# Altium footprint library devices.PCBLIB: 335 footprints (part 19 of 21)
Each footprint in its own frame and in the unit in brackets; x right, y up, seen from the top. Pads: shape width x height; smd on the part's side, far side on the other; paste and mask are expansions set on the pad; w line width, h text height; cw(c..) or ccw(c..) is an arc to the next point about the centre after c.
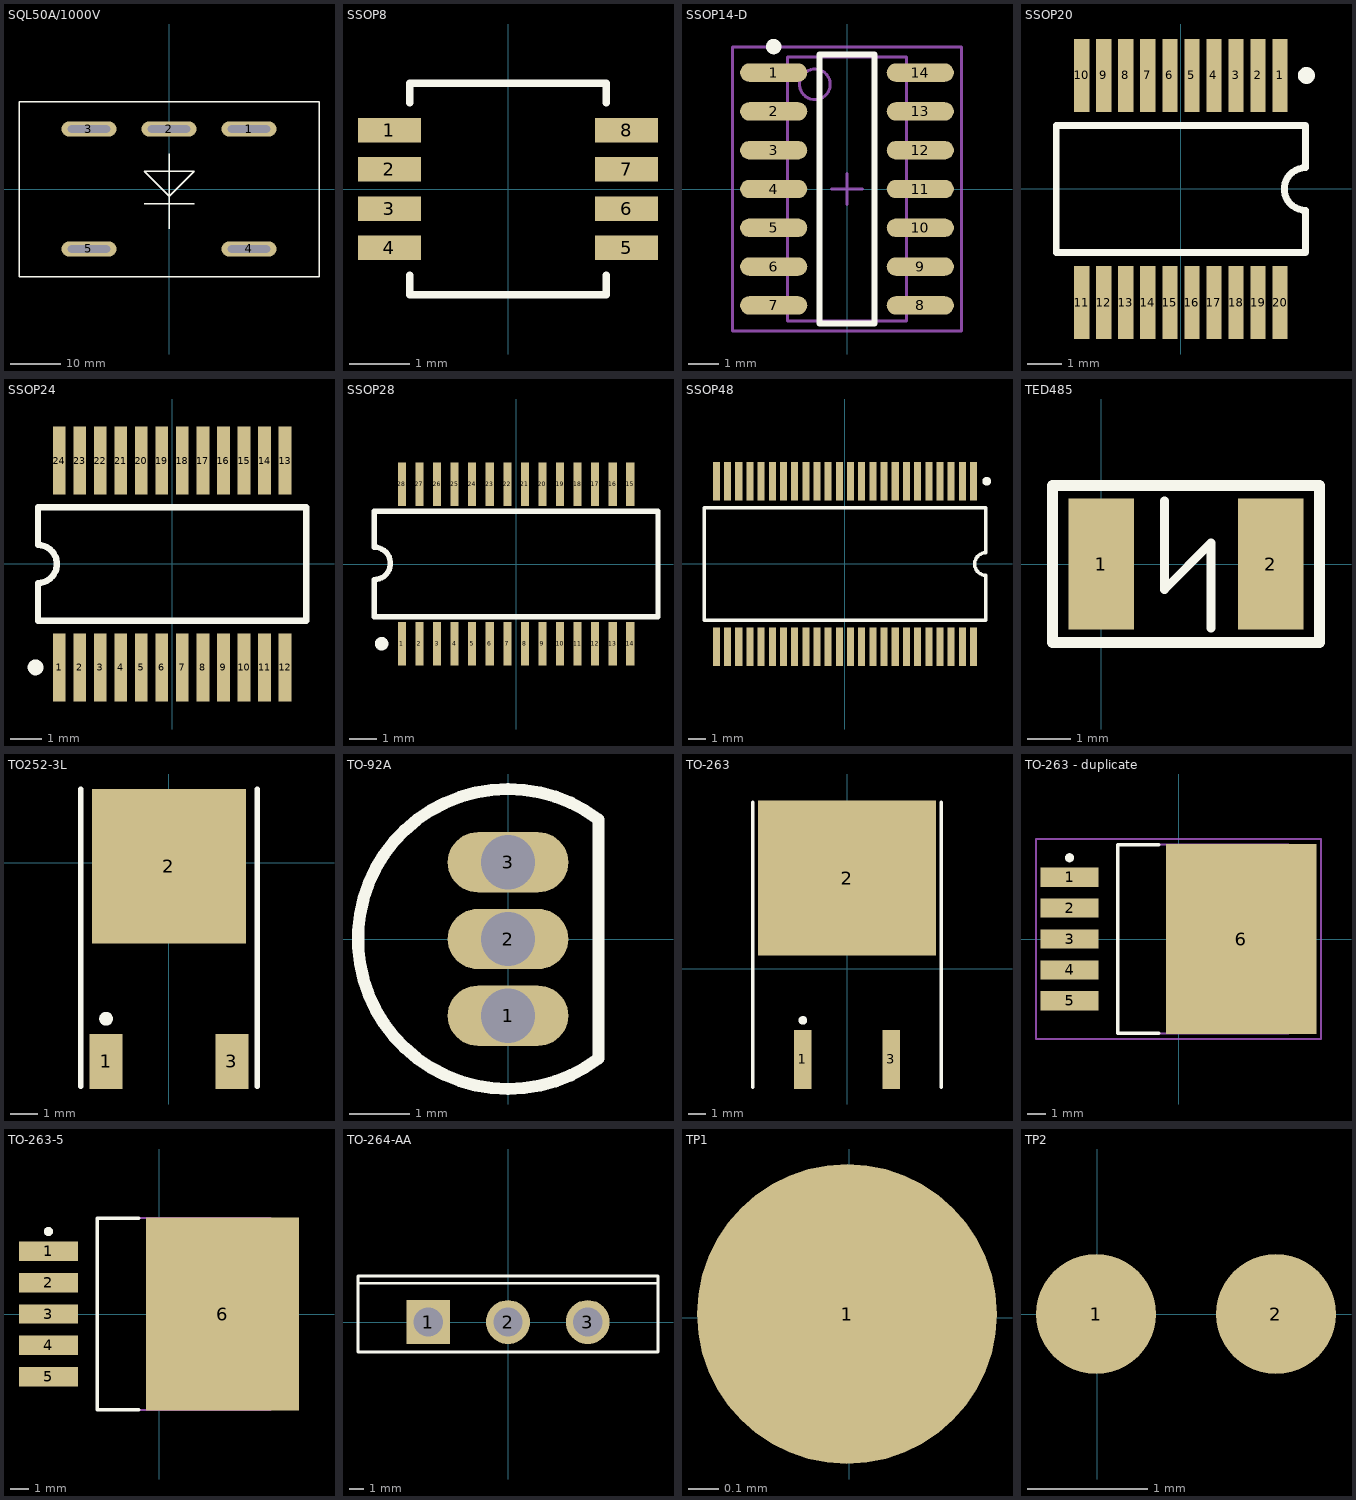
[diagram p18: the footprints below, top view; thin cyan lines are the x and y axes]

## SQL50A/1000V [mm]
pads (5):
  oval 11x3 hole 1.5 slot 8.5 at 0 deg: 1(16,12) 2(0,12) 3(-16,12) 4(16,-12) 5(-16,-12)
Top Overlay:
  lines w0.254: -5,-3 5,-3 ; 0,-8 0,7 ; -30,-17.5 30,-17.5 30,17.5 -30,17.5 -30,-17.5 ; -5,3.5 5,3.5 0,-1.5 -5,3.5

## SSOP8 [mil]
pads (8):
  rect 41x16 smd: 1(-77.26,38.39) 2(-77.26,12.8) 3(-77.26,-12.8) 4(-77.26,-38.39) 5(77.26,-38.39) 6(77.26,-12.8) 7(77.26,12.8) 8(77.26,38.39)
Top Overlay:
  lines w5: -64.09,-56.39 -64.09,-69.01 64.09,-69.01 64.09,-56.39 ; -64.09,56.39 -64.09,69.01 64.09,69.01 64.09,56.39

## SSOP14-D [mm] "SOIC, 14-Leads, Body 8.7x3.9mm, Pitch 1.27mm, IPC Medium Density"
height 1.75
pads (14):
  oval 2.2x0.6 smd: 1(-2.4,3.81) 2(-2.4,2.54) 3(-2.4,1.27) 4(-2.4,0) 5(-2.4,-1.27) 6(-2.4,-2.54) 7(-2.4,-3.81) 8(2.4,-3.81) 9(2.4,-2.54) 10(2.4,-1.27) 11(2.4,0) 12(2.4,1.27) 13(2.4,2.54) 14(2.4,3.81)
Top Overlay:
  circle w0.25: c-2.4,4.66 r0.125
  lines w0.2: -0.9,-4.4 0.9,-4.4 0.9,4.4 -0.9,4.4 -0.9,-4.4
Mechanical 13:
  circle w0.1: c-1.05,3.425 r0.5
  lines w0.1: -1.95,-4.325 1.95,-4.325 1.95,4.325 -1.95,4.325 -1.95,-4.325
Mechanical 15:
  lines w0.1: -0.5,0 0.5,0 ; 0,-0.5 0,0.5 ; -3.75,-4.65 3.75,-4.65 3.75,4.65 -3.75,4.65 -3.75,-4.65
3D body: height 1.75, standoff 0, extent -1.95,-4.325 1.95,4.325

## SSOP20 [mm] "SSOP; 20 Leads; Body Width 5.3 mm; Pitch 0.65 mm"
height 1.99
pads (20):
  rect 0.45x2.15 smd: 1(2.925,3.35) 2(2.275,3.35) 3(1.625,3.35) 4(0.975,3.35) 5(0.325,3.35) 6(-0.325,3.35) 7(-0.975,3.35) 8(-1.625,3.35) 9(-2.275,3.35) 10(-2.925,3.35) 11(-2.925,-3.35) 12(-2.275,-3.35) 13(-1.625,-3.35) 14(-0.975,-3.35) 15(-0.325,-3.35) 16(0.325,-3.35) 17(0.975,-3.35) 18(1.625,-3.35) 19(2.275,-3.35) 20(2.925,-3.35)
Top Overlay:
  circle w0.25: c3.7,3.35 r0.125
  lines w0.2: -3.675,-1.875 -3.675,1.875 3.675,1.875 3.675,0.625 ccw(c3.675,0) 3.675,-0.625 3.675,-1.875 -3.675,-1.875
3D body: height 1.78, standoff -0.21, extent -3.25,-3.975 3.25,3.925

## SSOP24 [mm] "SSOP, Plastic; 24 Leads; Body Width 5.3 mm; Pitch 0.65 mm"
height 2
pads (24):
  rect 0.4x2.15 smd: 1(-3.575,-3.275) 2(-2.925,-3.275) 3(-2.275,-3.275) 4(-1.625,-3.275) 5(-0.975,-3.275) 6(-0.325,-3.275) 7(0.325,-3.275) 8(0.975,-3.275) 9(1.625,-3.275) 10(2.275,-3.275) 11(2.925,-3.275) 12(3.575,-3.275) 13(3.575,3.275) 14(2.925,3.275) 15(2.275,3.275) 16(1.625,3.275) 17(0.975,3.275) 18(0.325,3.275) 19(-0.325,3.275) 20(-0.975,3.275) 21(-1.625,3.275) 22(-2.275,3.275) 23(-2.925,3.275) 24(-3.575,3.275)
Top Overlay:
  circle w0.25: c-4.325,-3.275 r0.125
  lines w0.2: -4.25,-1.8 4.25,-1.8 4.25,1.8 -4.25,1.8 -4.25,0.6 cw(c-4.25,0) -4.25,-0.6 -4.25,-1.8

## SSOP28 [mm] "SSOP, Plastic; 28 Leads; Body Width 5.3 mm; Pitch 0.65 mm"
height 2
pads (28):
  rect 0.3x1.6 smd: 1(-4.225,-2.95) 2(-3.575,-2.95) 3(-2.925,-2.95) 4(-2.275,-2.95) 5(-1.625,-2.95) 6(-0.975,-2.95) 7(-0.325,-2.95) 8(0.325,-2.95) 9(0.975,-2.95) 10(1.625,-2.95) 11(2.275,-2.95) 12(2.925,-2.95) 13(3.575,-2.95) 14(4.225,-2.95) 15(4.225,2.95) 16(3.575,2.95) 17(2.925,2.95) 18(2.275,2.95) 19(1.625,2.95) 20(0.975,2.95) 21(0.325,2.95) 22(-0.325,2.95) 23(-0.975,2.95) 24(-1.625,2.95) 25(-2.275,2.95) 26(-2.925,2.95) 27(-3.575,2.95) 28(-4.225,2.95)
Top Overlay:
  circle w0.25: c-4.975,-2.95 r0.125
  lines w0.2: -5.25,-1.95 5.25,-1.95 5.25,1.95 -5.25,1.95 -5.25,0.625 cw(c-5.25,0.025) -5.25,-0.575 -5.25,-1.95

## SSOP48 [mm] "SSOP; 48 Leads; Body Width 7.5 mm; Pitch 0.635 mm"
height 2.79
pads (48):
  rect 0.4x2.2 smd: 1(7.302,4.7) 2(6.667,4.7) 3(6.032,4.7) 4(5.397,4.7) 5(4.763,4.7) 6(4.127,4.7) 7(3.492,4.7) 8(2.857,4.7) 9(2.222,4.7) 10(1.587,4.7) 11(0.953,4.7) 12(0.318,4.7) 13(-0.318,4.7) 14(-0.953,4.7) 15(-1.587,4.7) 16(-2.222,4.7) 17(-2.857,4.7) 18(-3.492,4.7) 19(-4.127,4.7) 20(-4.763,4.7) 21(-5.397,4.7) 22(-6.032,4.7) 23(-6.667,4.7) 24(-7.302,4.7) 25(-7.302,-4.7) 26(-6.667,-4.7) 27(-6.032,-4.7) 28(-5.397,-4.7) 29(-4.763,-4.7) 30(-4.127,-4.7) 31(-3.492,-4.7) 32(-2.857,-4.7) 33(-2.222,-4.7) 34(-1.587,-4.7) 35(-0.953,-4.7) 36(-0.318,-4.7) 37(0.318,-4.7) 38(0.953,-4.7) 39(1.587,-4.7) 40(2.222,-4.7) 41(2.857,-4.7) 42(3.492,-4.7) 43(4.127,-4.7) 44(4.763,-4.7) 45(5.397,-4.7) 46(6.032,-4.7) 47(6.667,-4.7) 48(7.302,-4.7)
Top Overlay:
  circle w0.25: c8.053,4.7 r0.125
  lines w0.2: -8,-3.2 -8,3.2 8,3.2 8,0.635 ccw(c8,0) 8,-0.635 8,-3.2 -8,-3.2

## TED485 [mm]
pads (2):
  rect 1.5x3 smd: 1(0,0) 2(3.886,0)
Top Overlay:
  lines w0.2: 1.448,1.448 1.448,-0.584 2.515,0.483 2.515,-1.473
  lines w0.254: -1.118,-1.803 5.004,-1.803 5.004,1.803 -1.118,1.803 -1.118,1.142 -1.118,-1.803

## TO252-3L [mm] "PowerFLEX (D-PAK/TO-252-AA); 3 Leads (1 Cropped); Body 9.7 (inc. leads) x 6.2 mm (LxW max)"
height 2.03
pads (3):
  rect 1.2x2 smd: 1(-2.285,-7.214) 3(2.285,-7.214)
  rect 5.6x5.6 smd: 2(0,-0.127)
Top Overlay:
  circle w0.25: c-2.285,-5.664 r0.125
  lines w0.2: -3.2,-8.114 -3.2,2.667 ; 3.2,-8.114 3.2,2.667

## TO-92A [mm] "TO, Flat Index; 3 In-Line, Axial Leads; Body Dia. 4.5mm; Leads 0.51 x 0.48 mm (max)"
height 6.86
pads (3):
  oval 2x1 hole 0.9: 1(0,-1.27) 2(0,0) 3(0,1.27)
Top Overlay:
  lines w0.2: 1.5,-1.98 cw(c0,0) 1.5,1.98 1.5,-1.98

## TO-263 [mm] "D2-PAK/TO-263-AB; 3 Leads (1 Cropped); Body 15.9 (inc. leads) x 10.4 mm (LxW max)"
height 4.6
pads (3):
  rect 1x3.4 smd: 1(-2.54,-5.225) 3(2.54,-5.225)
  rect 10.25x8.9 smd: 2(0,5.225)
Top Overlay:
  circle w0.25: c-2.54,-2.975 r0.125
  lines w0.2: -5.425,-6.825 -5.425,9.575 ; 5.425,-6.825 5.425,9.575

## TO-263 - duplicate [mm] "D2-PAK, 6-Leads, Body 8.6x10.2mm, Pitch 1.7mm, Lead Span 14.1mm, IPC Medium Density"
height 4.65
pads (6):
  rect 3.2x1.05 smd: 1(-6,3.4) 2(-6,1.7) 3(-6,0) 4(-6,-1.7) 5(-6,-3.4)
  rect 8.3x10.45 smd: 6(3.45,0)
Top Overlay:
  circle w0.25: c-6,4.475 r0.125
  lines w0.2: -1.1,-5.2 -3.35,-5.2 -3.35,5.2 -1.1,5.2
Mechanical 13:
  lines w0.1: -3.35,-5.2 -3.35,5.2 6.05,5.2 6.05,-5.2 -3.35,-5.2
Mechanical 15:
  lines w0.1: -0.5,0 0.5,0 ; 0,-0.5 0,0.5 ; -7.85,-5.5 -7.85,5.5 7.85,5.5 7.85,-5.5 -7.85,-5.5
3D body: height 4.65, standoff 0, extent -3.35,-5.2 6.05,5.2

## TO-263-5 [mm] "D2-PAK, 6-Leads, Body 8.6x10.2mm, Pitch 1.7mm, Lead Span 14.1mm, IPC Medium Density"
height 4.65
pads (6):
  rect 3.2x1.05 smd: 1(-6,3.4) 2(-6,1.7) 3(-6,0) 4(-6,-1.7) 5(-6,-3.4)
  rect 8.3x10.45 smd: 6(3.45,0)
Top Overlay:
  circle w0.25: c-6,4.475 r0.125
  lines w0.2: -1.1,-5.2 -3.35,-5.2 -3.35,5.2 -1.1,5.2
Mechanical 13:
  lines w0.1: -3.35,-5.2 6.05,-5.2 6.05,5.2 -3.35,5.2 -3.35,-5.2
Mechanical 15:
  lines w0.1: -0.5,0 0.5,0 ; 0,-0.5 0,0.5
3D body: height 4.65, standoff 0, extent -3.35,-5.2 6.05,5.2

## TO-264-AA [mm] "SIP with Mounting Hole; 3 Leads; Body 26 x 20 x 5 mm (typ); Pitch 5.45 mm"
height 29
pads (3):
  rect 3x3 hole 2: 1(-5.45,0)
  round 3 hole 2: 2(0,0) 3(5.45,0)
Top Overlay:
  lines w0.2: -10.25,2.65 10.25,2.65 ; -10.25,-2.05 -10.25,3.15 10.25,3.15 10.25,-2.05 -10.25,-2.05
Mechanical 15:
  lines w0.1: -0.5,0 0.5,0 ; 0,-0.5 0,0.5

## TP1 [mm]
pads (1):
  round 1 smd: 1(-0.008,0.012)

## TP2 [mm]
pads (2):
  round 1 smd: 1(-0.01,0) 2(1.49,0)